# Altium footprint library Cty1.PcbLib: 869 footprints (part 19 of 55)
Each footprint in its own frame and in the unit in brackets; x right, y up, seen from the top. Pads: shape width x height; smd on the part's side, far side on the other; paste and mask are expansions set on the pad; w line width, h text height; cw(c..) or ccw(c..) is an arc to the next point about the centre after c.
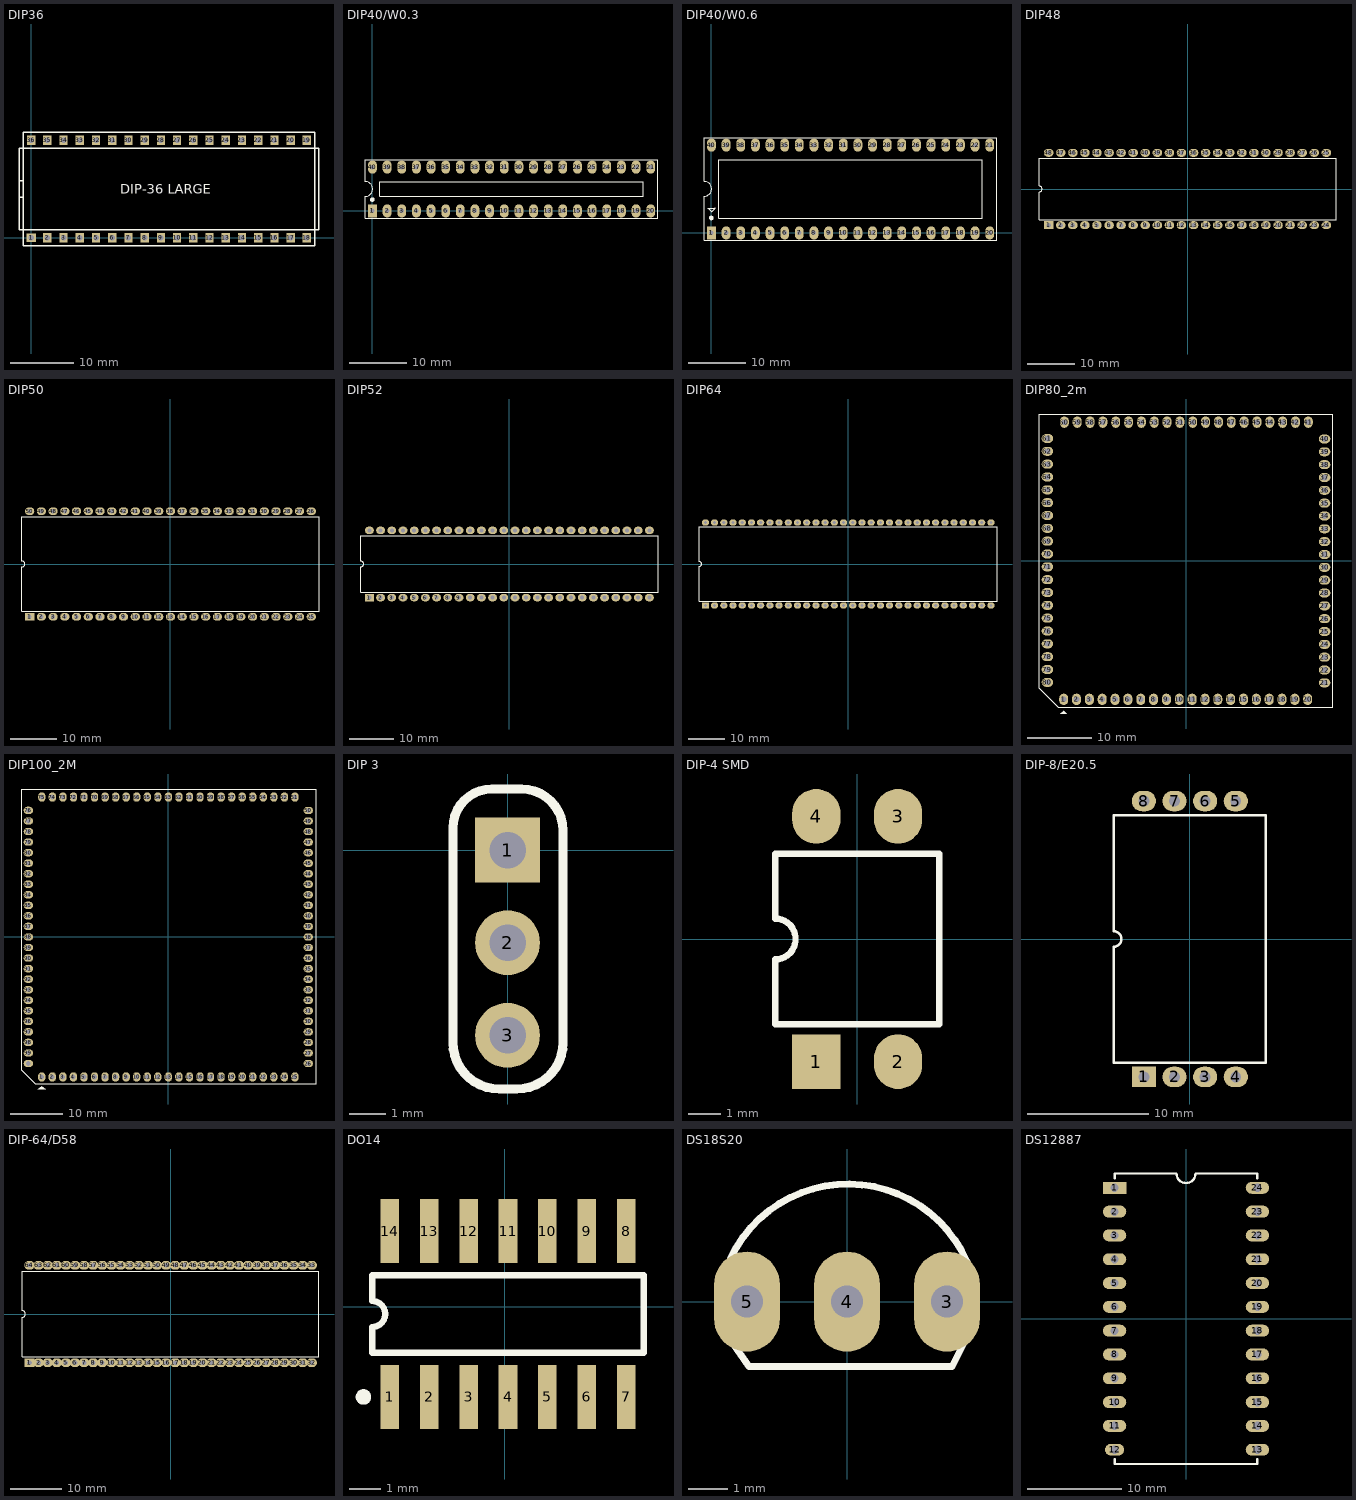
[diagram p18: the footprints below, top view; thin cyan lines are the x and y axes]

## DIP36 [mil] "W.600/L1.850"
pads (36):
  rect 59x51 / inner rect 58x58 / far side rect 59x51 hole 34: 1(0,0)
  rect 51x59 / inner round 58 / far side rect 51x59 hole 34: 2(100,0) 3(200,0) 4(300,0) 5(400,0) 6(500,0) 7(600,0) 8(700,0) 9(800,0) 10(900,0) 11(1000,0) 12(1100,0) 13(1200,0) 14(1300,0) 15(1400,0) 16(1500,0) 17(1600,0) 18(1700,0) 19(1700,600) 20(1600,600) 21(1500,600) 22(1400,600) 23(1300,600) 24(1200,600) 25(1100,600) 26(1000,600) 27(900,600) 28(800,600) 29(700,600) 30(600,600) 31(500,600) 32(400,600) 33(300,600) 34(200,600) 35(100,600) 36(0,600)
Top Overlay:
  lines w8: -75,50 1775,50 ; -75,50 -75,250 ; -75,50 1775,50 ; -75,50 -75,250 ; -75,250 -75,350 ; -75,250 -50,250 ; -75,250 -75,350 ; -75,250 -50,250 ; -75,350 -75,550 ; -75,350 -50,350 ; -75,350 -75,550 ; -75,350 -50,350 ; -75,550 1775,550 ; -75,550 1775,550 ; -50,250 -50,350 ; -50,250 -50,350 ; -50,350 -50,-50 1750,-50 1750,650 -50,650 -50,350 ; 1775,50 1775,550 ; 1775,50 1775,550
  text "DIP-36 LARGE" at 550,270 h59.05

## DIP40/W0.3 [mil] "40 PIN, W 300mil, Pin to pin 100mil"
height 100
pads (40):
  rect 60x90 hole 31: 1(0,0)
  oval 60x90 hole 31: 2(100,0) 3(200,0) 4(300,0) 5(400,0) 6(500,0) 7(600,0) 8(700,0) 9(800,0) 10(900,0) 11(1000,0) 12(1100,0) 13(1200,0) 14(1300,0) 15(1400,0) 16(1500,0) 17(1600,0) 18(1700,0) 19(1800,0) 20(1900,0) 21(1900,300) 22(1800,300) 23(1700,300) 24(1600,300) 25(1500,300) 26(1400,300) 27(1300,300) 28(1200,300) 29(1100,300) 30(1000,300) 31(900,300) 32(800,300) 33(700,300) 34(600,300) 35(500,300) 36(400,300) 37(300,300) 38(200,300) 39(100,300) 40(0,300)
Top Overlay:
  circle w15: c-1,78 r8
  lines w7: -50.38,100.05 ccw(c-48.69,150.02) -50,200 ; -50,100 -50,-50 1950,-50 1950,350 -50,350 -50,201 ; 50,100 1850,100 1850,200 50,200 50,100
3D body: height 227.95, standoff -129.92, extent -70,-160.91 2000.87,440.91

## DIP40/W0.6 [mil] "40 PIN, W 600mil, Pin to pin 100mil"
height 100
pads (40):
  rect 60x90 hole 31: 1(0,0)
  oval 60x90 hole 31: 2(100,0) 3(200,0) 4(300,0) 5(400,0) 6(500,0) 7(600,0) 8(700,0) 9(800,0) 10(900,0) 11(1000,0) 12(1100,0) 13(1200,0) 14(1300,0) 15(1400,0) 16(1500,0) 17(1600,0) 18(1700,0) 19(1800,0) 20(1900,0) 21(1900,600) 22(1800,600) 23(1700,600) 24(1600,600) 25(1500,600) 26(1400,600) 27(1300,600) 28(1200,600) 29(1100,600) 30(1000,600) 31(900,600) 32(800,600) 33(700,600) 34(600,600) 35(500,600) 36(400,600) 37(300,600) 38(200,600) 39(100,600) 40(0,600)
Top Overlay:
  circle w15: c-1,102 r8
  lines w7: -50.38,251.05 ccw(c-48.69,301.02) -50,351 ; -50,251 -50,-50 1950,-50 1950,650 -50,650 -50,352 ; -24,170 -23,170 1,146 1,145 25,169 25,171 24,170 -24,170 ; 50,100 1850,100 1850,500 50,500 50,100
3D body: height 224.41, standoff -101.57, extent -82.48,-10 1982.48,599.84

## DIP48 [mm] "DIP, Moulded; 48 Leads; Row Spacing 15.24 mm; Pitch 2.54 mm"
height 5.34
pads (48):
  rect 2x1.7 hole 0.9: 1(-29.21,-7.62)
  oval 2x1.7 hole 0.9: 2(-26.67,-7.62) 3(-24.13,-7.62) 4(-21.59,-7.62) 5(-19.05,-7.62) 6(-16.51,-7.62) 7(-13.97,-7.62) 8(-11.43,-7.62) 9(-8.89,-7.62) 10(-6.35,-7.62) 11(-3.81,-7.62) 12(-1.27,-7.62) 13(1.27,-7.62) 14(3.81,-7.62) 15(6.35,-7.62) 16(8.89,-7.62) 17(11.43,-7.62) 18(13.97,-7.62) 19(16.51,-7.62) 20(19.05,-7.62) 21(21.59,-7.62) 22(24.13,-7.62) 23(26.67,-7.62) 24(29.21,-7.62) 25(29.21,7.62) 26(26.67,7.62) 27(24.13,7.62) 28(21.59,7.62) 29(19.05,7.62) 30(16.51,7.62) 31(13.97,7.62) 32(11.43,7.62) 33(8.89,7.62) 34(6.35,7.62) 35(3.81,7.62) 36(1.27,7.62) 37(-1.27,7.62) 38(-3.81,7.62) 39(-6.35,7.62) 40(-8.89,7.62) 41(-11.43,7.62) 42(-13.97,7.62) 43(-16.51,7.62) 44(-19.05,7.62) 45(-21.59,7.62) 46(-24.13,7.62) 47(-26.67,7.62) 48(-29.21,7.62)
Top Overlay:
  lines w0.2: -31.25,-6.45 -31.25,-0.635 ccw(c-31.25,0) -31.25,0.635 -31.25,6.45 31.25,6.45 31.25,-6.45 -31.25,-6.45

## DIP50 [mm] "Ceramic DIP; 50 Leads; Row Spacing 22.86 mm; Pitch 2.54 mm"
height 5.08
pads (50):
  rect 2x1.7 hole 0.9: 1(-30.48,-11.43)
  oval 2x1.7 hole 0.9: 2(-27.94,-11.43) 3(-25.4,-11.43) 4(-22.86,-11.43) 5(-20.32,-11.43) 6(-17.78,-11.43) 7(-15.24,-11.43) 8(-12.7,-11.43) 9(-10.16,-11.43) 10(-7.62,-11.43) 11(-5.08,-11.43) 12(-2.54,-11.43) 13(0,-11.43) 14(2.54,-11.43) 15(5.08,-11.43) 16(7.62,-11.43) 17(10.16,-11.43) 18(12.7,-11.43) 19(15.24,-11.43) 20(17.78,-11.43) 21(20.32,-11.43) 22(22.86,-11.43) 23(25.4,-11.43) 24(27.94,-11.43) 25(30.48,-11.43) 26(30.48,11.43) 27(27.94,11.43) 28(25.4,11.43) 29(22.86,11.43) 30(20.32,11.43) 31(17.78,11.43) 32(15.24,11.43) 33(12.7,11.43) 34(10.16,11.43) 35(7.62,11.43) 36(5.08,11.43) 37(2.54,11.43) 38(0,11.43) 39(-2.54,11.43) 40(-5.08,11.43) 41(-7.62,11.43) 42(-10.16,11.43) 43(-12.7,11.43) 44(-15.24,11.43) 45(-17.78,11.43) 46(-20.32,11.43) 47(-22.86,11.43) 48(-25.4,11.43) 49(-27.94,11.43) 50(-30.48,11.43)
Top Overlay:
  lines w0.2: -32.15,-10.25 -32.15,-0.635 ccw(c-32.15,0) -32.15,0.635 -32.15,10.25 32.15,10.25 32.15,-10.25 -32.15,-10.25

## DIP52 [mm] "Ceramic DIP; 52 Leads; Row Spacing 15.24 mm; Pitch 2.54 mm"
height 5.08
pads (52):
  rect 2x1.7 hole 0.9: 1(-31.75,-7.62)
  oval 2x1.7 hole 0.9: 2(-29.21,-7.62) 3(-26.67,-7.62) 4(-24.13,-7.62) 5(-21.59,-7.62) 6(-19.05,-7.62) 7(-16.51,-7.62) 8(-13.97,-7.62) 9(-11.43,-7.62) 10(-8.89,-7.62) 11(-6.35,-7.62) 12(-3.81,-7.62) 13(-1.27,-7.62) 14(1.27,-7.62) 15(3.81,-7.62) 16(6.35,-7.62) 17(8.89,-7.62) 18(11.43,-7.62) 19(13.97,-7.62) 20(16.51,-7.62) 21(19.05,-7.62) 22(21.59,-7.62) 23(24.13,-7.62) 24(26.67,-7.62) 25(29.21,-7.62) 26(31.75,-7.62) 27(31.75,7.62) 28(29.21,7.62) 29(26.67,7.62) 30(24.13,7.62) 31(21.59,7.62) 32(19.05,7.62) 33(16.51,7.62) 34(13.97,7.62) 35(11.43,7.62) 36(8.89,7.62) 37(6.35,7.62) 38(3.81,7.62) 39(1.27,7.62) 40(-1.27,7.62) 41(-3.81,7.62) 42(-6.35,7.62) 43(-8.89,7.62) 44(-11.43,7.62) 45(-13.97,7.62) 46(-16.51,7.62) 47(-19.05,7.62) 48(-21.59,7.62) 49(-24.13,7.62) 50(-26.67,7.62) 51(-29.21,7.62) 52(-31.75,7.62)
Top Overlay:
  lines w0.2: -33.7,-6.45 -33.7,-0.635 ccw(c-33.7,0) -33.7,0.635 -33.7,6.45 33.7,6.45 33.7,-6.45 -33.7,-6.45

## DIP64 [mm] "DIP; 64 Leads; Row Spacing 22.86 mm; Pitch 2.54 mm"
height 5.84
pads (64):
  rect 2x1.7 hole 0.9: 1(-39.37,-11.43)
  oval 2x1.7 hole 0.9: 2(-36.83,-11.43) 3(-34.29,-11.43) 4(-31.75,-11.43) 5(-29.21,-11.43) 6(-26.67,-11.43) 7(-24.13,-11.43) 8(-21.59,-11.43) 9(-19.05,-11.43) 10(-16.51,-11.43) 11(-13.97,-11.43) 12(-11.43,-11.43) 13(-8.89,-11.43) 14(-6.35,-11.43) 15(-3.81,-11.43) 16(-1.27,-11.43) 17(1.27,-11.43) 18(3.81,-11.43) 19(6.35,-11.43) 20(8.89,-11.43) 21(11.43,-11.43) 22(13.97,-11.43) 23(16.51,-11.43) 24(19.05,-11.43) 25(21.59,-11.43) 26(24.13,-11.43) 27(26.67,-11.43) 28(29.21,-11.43) 29(31.75,-11.43) 30(34.29,-11.43) 31(36.83,-11.43) 32(39.37,-11.43) 33(39.37,11.43) 34(36.83,11.43) 35(34.29,11.43) 36(31.75,11.43) 37(29.21,11.43) 38(26.67,11.43) 39(24.13,11.43) 40(21.59,11.43) 41(19.05,11.43) 42(16.51,11.43) 43(13.97,11.43) 44(11.43,11.43) 45(8.89,11.43) 46(6.35,11.43) 47(3.81,11.43) 48(1.27,11.43) 49(-1.27,11.43) 50(-3.81,11.43) 51(-6.35,11.43) 52(-8.89,11.43) 53(-11.43,11.43) 54(-13.97,11.43) 55(-16.51,11.43) 56(-19.05,11.43) 57(-21.59,11.43) 58(-24.13,11.43) 59(-26.67,11.43) 60(-29.21,11.43) 61(-31.75,11.43) 62(-34.29,11.43) 63(-36.83,11.43) 64(-39.37,11.43)
Top Overlay:
  lines w0.2: -41.05,-10.25 41.05,-10.25 41.05,10.25 -41.05,10.25 -41.05,0.635 cw(c-41.05,0) -41.05,-0.635 -41.05,-10.25

## DIP80_2m [mil] "DIP80, P - P 200"
pads (80):
  oval 55x70 hole 35: 1(-750,-850) 2(-671.26,-850) 3(-592.52,-850) 4(-513.78,-850) 5(-435.04,-850) 6(-356.3,-850) 7(-277.56,-850) 8(-198.82,-850) 9(-120.08,-850) 10(-41.34,-850) 11(37.4,-850) 12(116.14,-850) 13(194.88,-850) 14(273.62,-850) 15(352.36,-850) 16(431.1,-850) 17(509.84,-850) 18(588.58,-850) 19(667.32,-850) 20(746.06,-850) 41(750,850) 42(671.26,850) 43(592.52,850) 44(513.78,850) 45(435.04,850) 46(356.3,850) 47(277.56,850) 48(198.82,850) 49(120.08,850) 50(41.34,850) 51(-37.4,850) 52(-116.14,850) 53(-194.88,850) 54(-273.62,850) 55(-352.36,850) 56(-431.1,850) 57(-509.84,850) 58(-588.58,850) 59(-667.32,850) 60(-746.06,850)
  oval 70x55 hole 35: 21(850,-749) 22(850,-670.26) 23(850,-591.52) 24(850,-512.78) 25(850,-434.04) 26(850,-355.3) 27(850,-276.56) 28(850,-197.82) 29(850,-119.08) 30(850,-40.34) 31(850,38.4) 32(850,117.14) 33(850,195.88) 34(850,274.62) 35(850,353.36) 36(850,432.1) 37(850,510.84) 38(850,589.58) 39(850,668.32) 40(850,747.06) 61(-850,750) 62(-850,671.26) 63(-850,592.52) 64(-850,513.78) 65(-850,435.04) 66(-850,356.3) 67(-850,277.56) 68(-850,198.82) 69(-850,120.08) 70(-850,41.34) 71(-850,-37.4) 72(-850,-116.14) 73(-850,-194.88) 74(-850,-273.62) 75(-850,-352.36) 76(-850,-431.1) 77(-850,-509.84) 78(-850,-588.58) 79(-850,-667.32) 80(-850,-746.06)
Top Overlay:
  region: -770,-940 -750,-920 -730,-940
  lines w7: -900,-783 -783,-900 900,-900 900,900 -900,900 -900,-783

## DIP100_2M [mil] "DIP100 - P-P 2mm"
pads (100):
  oval 55x70 hole 35: 1(-945,-1045) 2(-866.26,-1045) 3(-787.52,-1045) 4(-708.78,-1045) 5(-630.04,-1045) 6(-551.3,-1045) 7(-472.56,-1045) 8(-393.82,-1045) 9(-315.08,-1045) 10(-236.34,-1045) 11(-157.6,-1045) 12(-78.86,-1045) 13(-0.12,-1045) 14(78.62,-1045) 15(157.36,-1045) 16(236.1,-1045) 17(314.84,-1045) 18(393.58,-1045) 19(472.32,-1045) 20(551.06,-1045) 21(629.8,-1045) 22(708.54,-1045) 23(787.28,-1045) 24(866.02,-1045) 25(944.76,-1045) 51(945,1045) 52(866.26,1045) 53(787.52,1045) 54(708.78,1045) 55(630.04,1045) 56(551.3,1045) 57(472.56,1045) 58(393.82,1045) 59(315.08,1045) 60(236.34,1045) 61(157.6,1045) 62(78.86,1045) 63(0.12,1045) 64(-78.62,1045) 65(-157.36,1045) 66(-236.1,1045) 67(-314.84,1045) 68(-393.58,1045) 69(-472.32,1045) 70(-551.06,1045) 71(-629.8,1045) 72(-708.54,1045) 73(-787.28,1045) 74(-866.02,1045) 75(-944.76,1045)
  oval 70x55 hole 35: 26(1045,-945) 27(1045,-866.26) 28(1045,-787.52) 29(1045,-708.78) 30(1045,-630.04) 31(1045,-551.3) 32(1045,-472.56) 33(1045,-393.82) 34(1045,-315.08) 35(1045,-236.34) 36(1045,-157.6) 37(1045,-78.86) 38(1045,-0.12) 39(1045,78.62) 40(1045,157.36) 41(1045,236.1) 42(1045,314.84) 43(1045,393.58) 44(1045,472.32) 45(1045,551.06) 46(1045,629.8) 47(1045,708.54) 48(1045,787.28) 49(1045,866.02) 50(1045,944.76) 76(-1045,945) 77(-1045,866.26) 78(-1045,787.52) 79(-1045,708.78) 80(-1045,630.04) 81(-1045,551.3) 82(-1045,472.56) 83(-1045,393.82) 84(-1045,315.08) 85(-1045,236.34) 86(-1045,157.6) 87(-1045,78.86) 88(-1045,0.12) 89(-1045,-78.62) 90(-1045,-157.36) 91(-1045,-236.1) 92(-1045,-314.84) 93(-1045,-393.58) 94(-1045,-472.32) 95(-1045,-551.06) 96(-1045,-629.8) 97(-1045,-708.54) 98(-1045,-787.28) 99(-1045,-866.02) 100(-1045,-944.76)
Top Overlay:
  region: -945,-1115 -975,-1135 -915,-1135
  lines w7: -1095,-995 -1095,1105 1105,1105 1105,-1095 -995,-1095 -1095,-995

## DIP 3 [mil]
pads (3):
  rect 70x70 hole 39.37 unplated: 1(0,0)
  round 70 hole 39.37 unplated: 2(0,-100) 3(0,-200)
Top Overlay:
  lines w10: -4,-258 10,-258 ccw(c10,-208) 60,-208 60,21 ccw(c15,21) 15,66 0,66 -17,66 ccw(c-17,24) -59,24 -59,-208 ccw(c-9,-208) -9,-258 -3,-258

## DIP-4 SMD [mm] "DIP; 4 Leads; Row Spacing 7.62 mm; Pitch 2.54 mm"
height 4.57
pads (4):
  rect 1.5x1.7 smd: 1(-1.27,-3.81)
  oval 1.5x1.7 smd: 2(1.27,-3.81) 3(1.27,3.81) 4(-1.27,3.81)
Top Overlay:
  lines w0.2: -2.55,-2.65 2.55,-2.65 2.55,2.65 -2.55,2.65 -2.55,0.635 cw(c-2.55,0) -2.55,-0.635 -2.55,-2.65

## DIP-8/E20.5 [mm] "DIP; 8 Leads; Row Spacing 22.86 mm; Pitch 2.54 mm"
height 5.24
pads (8):
  rect 2x1.7 hole 0.9: 1(-3.81,-11.43)
  oval 2x1.7 hole 0.9: 2(-1.27,-11.43) 3(1.27,-11.43) 4(3.81,-11.43) 5(3.81,11.43) 6(1.27,11.43) 7(-1.27,11.43) 8(-3.81,11.43)
Top Overlay:
  lines w0.2: 6.3,-10.2 6.3,10.25 -6.3,10.25 -6.3,0.635 cw(c-6.3,0) -6.3,-0.635 -6.3,-10.25 ; -6.3,-10.25 6.3,-10.25 -6.3,-10.25

## DIP-64/D58 [mm] "DIP; 64 Leads; Row Spacing 19.05 mm; Pitch 1.78 mm"
height 5.08
pads (64):
  rect 2x1.7 hole 0.9: 1(-27.59,-9.525)
  oval 2x1.7 hole 0.9: 2(-25.81,-9.525) 3(-24.03,-9.525) 4(-22.25,-9.525) 5(-20.47,-9.525) 6(-18.69,-9.525) 7(-16.91,-9.525) 8(-15.13,-9.525) 9(-13.35,-9.525) 10(-11.57,-9.525) 11(-9.79,-9.525) 12(-8.01,-9.525) 13(-6.23,-9.525) 14(-4.45,-9.525) 15(-2.67,-9.525) 16(-0.89,-9.525) 17(0.89,-9.525) 18(2.67,-9.525) 19(4.45,-9.525) 20(6.23,-9.525) 21(8.01,-9.525) 22(9.79,-9.525) 23(11.57,-9.525) 24(13.35,-9.525) 25(15.13,-9.525) 26(16.91,-9.525) 27(18.69,-9.525) 28(20.47,-9.525) 29(22.25,-9.525) 30(24.03,-9.525) 31(25.81,-9.525) 32(27.59,-9.525) 33(27.59,9.525) 34(25.81,9.525) 35(24.03,9.525) 36(22.25,9.525) 37(20.47,9.525) 38(18.69,9.525) 39(16.91,9.525) 40(15.13,9.525) 41(13.35,9.525) 42(11.57,9.525) 43(9.79,9.525) 44(8.01,9.525) 45(6.23,9.525) 46(4.45,9.525) 47(2.67,9.525) 48(0.89,9.525) 49(-0.89,9.525) 50(-2.67,9.525) 51(-4.45,9.525) 52(-6.23,9.525) 53(-8.01,9.525) 54(-9.79,9.525) 55(-11.57,9.525) 56(-13.35,9.525) 57(-15.13,9.525) 58(-16.91,9.525) 59(-18.69,9.525) 60(-20.47,9.525) 61(-22.25,9.525) 62(-24.03,9.525) 63(-25.81,9.525) 64(-27.59,9.525)
Top Overlay:
  lines w0.2: -29,-8.35 29,-8.35 29,8.35 -29,8.35 -29,0.635 cw(c-29,0) -29,-0.635 -29,-8.35

## DO14 [mm]
pads (14):
  rect 0.6x2.05 smd: 1(-3.698,-2.913) 2(-2.428,-2.913) 3(-1.158,-2.913) 4(0.112,-2.913) 5(1.382,-2.913) 6(2.652,-2.913) 7(3.922,-2.913) 8(3.922,2.437) 9(2.652,2.437) 10(1.382,2.437) 11(0.112,2.437) 12(-1.158,2.437) 13(-2.428,2.437) 14(-3.698,2.437)
Top Overlay:
  circle w0.25: c-4.548,-2.913 r0.125
  lines w0.2: -4.263,-1.488 -4.263,-0.655 ccw(c-4.263,-0.238) -4.263,0.179 -4.263,1.012 4.487,1.012 4.487,-1.488 -4.263,-1.488

## DS18S20 [mil] "TO-92"
height 200
pads (3):
  oval 66x100 hole 32: 3(100,0) 4(0,0) 5(-100,0)
Top Overlay:
  lines w7: -116.52,43.21 cw(c0.97,-12.43) 119.94,39.97 ; -115.34,-40.24 -98,-65 105,-65 118,-39

## DS12887 [mil]
pads (24):
  rect 98.42x50 hole 35: 1(-300,550)
  oval 98.43x50 hole 35: 2(-300,450) 3(-300,350) 4(-300,250) 5(-300,150) 6(-300,50) 7(-300,-50) 8(-300,-150) 9(-300,-250) 10(-300,-350) 11(-300,-450) 14(300,-450) 15(300,-350) 16(300,-250) 17(300,-150) 18(300,-50) 19(300,50) 20(300,150) 21(300,250) 22(300,350) 23(300,450) 24(300,550)
  oval 80x50 hole 35: 12(-300,-550)
  oval 98.42x50 hole 35: 13(300,-550)
Top Overlay:
  lines w10: -300,-590 -300,-610 300,-610 300,-590 ; -300,590 -300,610 -40,610 ccw(c0,610) 0,570 ccw(c0,610) 40,610 300,610 300,590